# Altium footprint library PcbLib1.PcbLib: 49 footprints (part 2 of 4)
Each footprint in its own frame and in the unit in brackets; x right, y up, seen from the top. Pads: shape width x height; smd on the part's side, far side on the other; paste and mask are expansions set on the pad; w line width, h text height; cw(c..) or ccw(c..) is an arc to the next point about the centre after c.
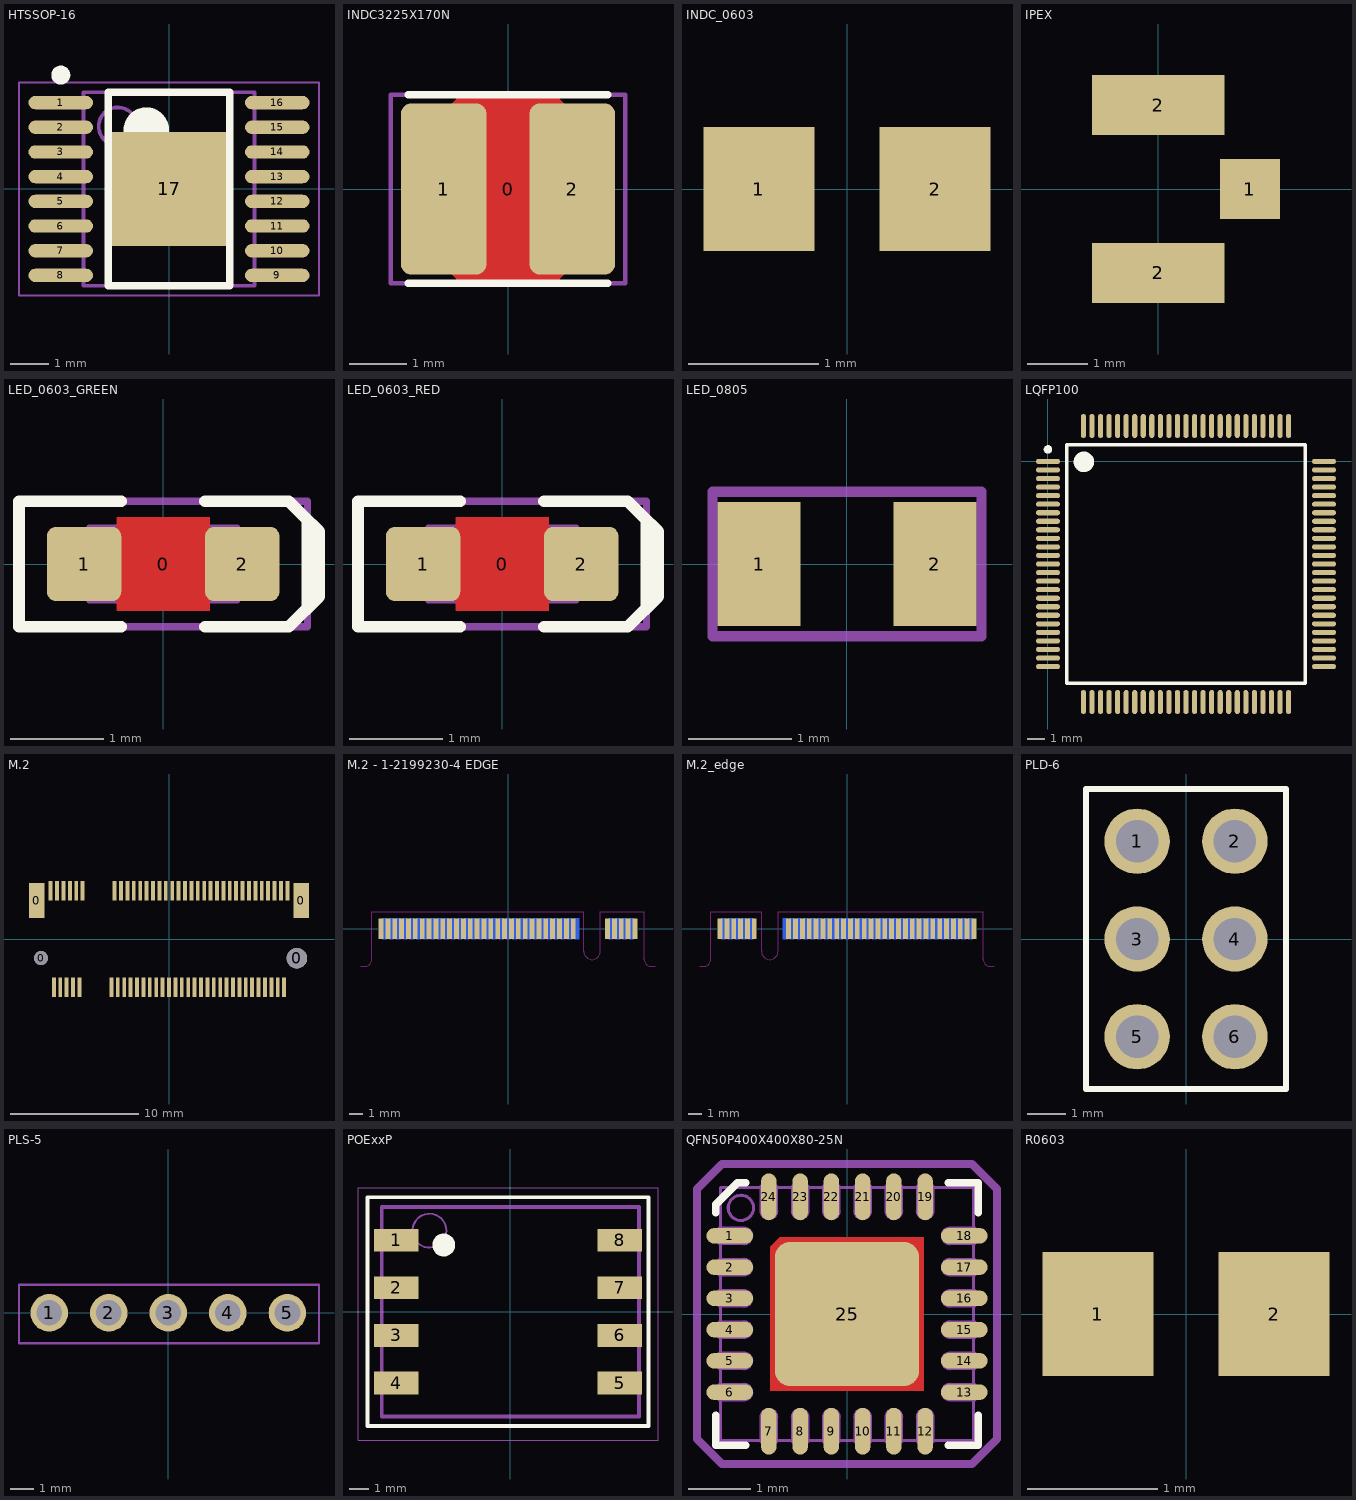
[diagram p1: the footprints below, top view; thin cyan lines are the x and y axes]

## HTSSOP-16 [mm] "HTSOP, 16-Leads, Body 5,00x4,40mm, Pitch 0,65mm, IPC Medium Density"
height 1.2
pads (17):
  oval 1.7x0.35 smd: 1(-2.85,2.275) 2(-2.85,1.625) 3(-2.85,0.975) 4(-2.85,0.325) 5(-2.85,-0.325) 6(-2.85,-0.975) 7(-2.85,-1.625) 8(-2.85,-2.275) 9(2.85,-2.275) 10(2.85,-1.625) 11(2.85,-0.975) 12(2.85,-0.325) 13(2.85,0.325) 14(2.85,0.975) 15(2.85,1.625) 16(2.85,2.275)
  rect 3x3 smd: 17(0,0)
Top Overlay:
  circle w0.6: c-0.6,1.55 r0.3
  circle w0.25: c-2.85,3 r0.125
  lines w0.2: -1.6,-2.55 1.6,-2.55 1.6,2.55 -1.6,2.55 -1.6,-2.55
Mechanical 13:
  circle w0.1: c-1.35,1.65 r0.5
  lines w0.1: -2.25,-2.55 2.25,-2.55 2.25,2.55 -2.25,2.55 -2.25,-2.55
Mechanical 15:
  lines w0.05: -3.95,-2.8 3.95,-2.8 3.95,2.8 -3.95,2.8 -3.95,-2.8
  lines w0.1: -0.5,0 0.5,0 ; 0,-0.5 0,0.5
3D body "User Library-TSSOP-16-1.step": height 1.1, standoff 0, extent -3.2,-2.5 3.2,2.5

## INDC3225X170N [mm] "Chip Inductor, 2-Leads, Body 3.2x2.5mm, IPC Medium Density"
height 1.7
pads (3):
  round 0.508 on Mech15: 0(0,0)
  rrect25% 1.5x3 smd: 1(-1.125,0) 2(1.125,0)
Top Layer:
  pour cut-out: -1.125,1.35 -0.825,1.65 0.825,1.65 1.125,1.35 1.125,-1.35 0.825,-1.65 -0.825,-1.65 -1.125,-1.35
Top Overlay:
  lines w0.127: -1.75,-1.651 1.75,-1.651 ; -1.75,1.651 1.75,1.651
Mechanical 13:
  lines w0.05: -1.7,-1.35 -1.7,1.35 1.7,1.35 1.7,-1.35 -1.7,-1.35
Mechanical 15:
  lines w0.076: -2.05,-1.65 2.05,-1.65 2.05,1.65 -2.05,1.65 -2.05,-1.65
3D body "INDC3225X170N.STEP": height 1.7, standoff 0, extent -1.71,-1.36 1.71,1.36

## INDC_0603 [mm] "Chip Inductor, 2-Leads, Body 1,60x1,00mm, IPC Medium Density"
height 1
pads (2):
  rect 0.85x0.95 smd: 1(-0.675,0) 2(0.675,0)
3D body "Coilcraft-0603CT.step": height 0.59, standoff -0.03, extent -0.785,-0.42 0.785,0.42

## IPEX [mm]
pads (3):
  rect 1x1 smd: 1(1.524,0)
  rect 2.2x1 smd: 2(0,-1.397) 2(0,1.397)
3D body "User Library-20279-001.step": height 1.25, standoff -0.01, extent -1.55,-1.5 1.55,1.5

## LED_0603_GREEN [mm]
height 0.8
pads (3):
  round 0.254 on Mech15: 0(0,0)
  rrect25% 0.8x0.8 smd: 1(-0.85,0) 2(0.85,0)
Top Layer:
  pour cut-out: -0.5,0.5 0.5,0.5 0.5,-0.5 -0.5,-0.5
Top Overlay:
  lines w0.127: -0.45,-0.675 -1.55,-0.675 -1.55,0.675 -0.45,0.675 ; 0.45,-0.675 1.35,-0.675 1.55,-0.475 1.55,0.475 1.35,0.675 0.45,0.675 ; 1.5,0.525 1.675,0.35 1.675,-0.35 1.525,-0.5
Mechanical 13:
  lines w0.05: -0.6,-0.4 -0.6,0.399 0.6,0.4 0.6,-0.4 -0.6,-0.399 ; -0.505,-0.398 -0.505,0.398 ; -0.5,-0.4 -0.8,-0.4 -0.8,0.4 -0.5,0.4 ; 0.5,-0.4 0.8,-0.4 0.8,0.4 0.5,0.4 ; 0.505,-0.398 0.505,0.398 ; -0.599,-0.398 -0.599,0.398 0.599,0.398 0.599,-0.398 -0.599,-0.398
Mechanical 15:
  lines w0.076: -1.55,-0.675 1.55,-0.675 1.55,0.675 -1.55,0.675 -1.55,-0.675
3D body "User Library-LED_0603_G.STEP": height 0.6, standoff 0, extent -0.8,-0.4 0.8,0.4

## LED_0603_RED [mm]
height 0.8
pads (3):
  round 0.254 on Mech15: 0(0,0)
  rrect25% 0.8x0.8 smd: 1(-0.85,0) 2(0.85,0)
Top Layer:
  pour cut-out: -0.5,0.5 0.5,0.5 0.5,-0.5 -0.5,-0.5
Top Overlay:
  lines w0.127: -0.45,-0.675 -1.55,-0.675 -1.55,0.675 -0.45,0.675 ; 0.45,-0.675 1.35,-0.675 1.55,-0.475 1.55,0.475 1.35,0.675 0.45,0.675 ; 1.5,0.525 1.675,0.35 1.675,-0.35 1.525,-0.5
Mechanical 13:
  lines w0.05: -0.6,-0.4 -0.6,0.399 0.6,0.4 0.6,-0.4 -0.6,-0.399 ; -0.505,-0.398 -0.505,0.398 ; -0.5,-0.4 -0.8,-0.4 -0.8,0.4 -0.5,0.4 ; 0.5,-0.4 0.8,-0.4 0.8,0.4 0.5,0.4 ; 0.505,-0.398 0.505,0.398 ; -0.599,-0.398 0.599,-0.398 0.599,0.398 -0.599,0.398 -0.599,-0.398
Mechanical 15:
  lines w0.076: -1.55,-0.675 -1.55,0.675 1.55,0.675 1.55,-0.675 -1.55,-0.675
3D body "LED 0603 APT1608 RED.STEP": height 0.75, standoff 0, extent -0.8,-0.4 0.8,0.4

## LED_0805 [mm]
pads (2):
  rect 0.8x1.2 smd: 1(-0.85,0) 2(0.85,0)
Mechanical 15:
  lines w0.1: -1.3,-0.7 -1.3,0.7 1.3,0.7 1.3,-0.7 -1.3,-0.7
3D body "LED-0805.step": height 0.9, standoff -0.01, extent -1.05,-0.675 1.05,0.675

## LQFP100 [mm]
pads (100):
  oval 1.4x0.3 smd: 1(0,0) 2(0,-0.5) 3(0,-1) 4(0,-1.5) 5(0,-2) 6(0,-2.5) 7(0,-3) 8(0,-3.5) 9(0,-4) 10(0,-4.5) 11(0,-5) 12(0,-5.5) 13(0,-6) 14(0,-6.5) 15(0,-7) 16(0,-7.5) 17(0,-8) 18(0,-8.5) 19(0,-9) 20(0,-9.5) 21(0,-10) 22(0,-10.5) 23(0,-11) 24(0,-11.5) 25(0,-12) 51(16.15,-12) 52(16.15,-11.5) 53(16.15,-11) 54(16.15,-10.5) 55(16.15,-10) 56(16.15,-9.5) 57(16.15,-9) 58(16.15,-8.5) 59(16.15,-8) 60(16.15,-7.5) 61(16.15,-7) 62(16.15,-6.5) 63(16.15,-6) 64(16.15,-5.5) 65(16.15,-5) 66(16.15,-4.5) 67(16.15,-4) 68(16.15,-3.5) 69(16.15,-3) 70(16.15,-2.5) 71(16.15,-2) 72(16.15,-1.5) 73(16.15,-1) 74(16.15,-0.5) 75(16.15,0)
  oval 0.3x1.4 smd: 26(2.075,-14.075) 27(2.575,-14.075) 28(3.075,-14.075) 29(3.575,-14.075) 30(4.075,-14.075) 31(4.575,-14.075) 32(5.075,-14.075) 33(5.575,-14.075) 34(6.075,-14.075) 35(6.575,-14.075) 36(7.075,-14.075) 37(7.575,-14.075) 38(8.075,-14.075) 39(8.575,-14.075) 40(9.075,-14.075) 41(9.575,-14.075) 42(10.075,-14.075) 43(10.575,-14.075) 44(11.075,-14.075) 45(11.575,-14.075) 46(12.075,-14.075) 47(12.575,-14.075) 48(13.075,-14.075) 49(13.575,-14.075) 50(14.075,-14.075) 76(14.075,2.075) 77(13.575,2.075) 78(13.075,2.075) 79(12.575,2.075) 80(12.075,2.075) 81(11.575,2.075) 82(11.075,2.075) 83(10.575,2.075) 84(10.075,2.075) 85(9.575,2.075) 86(9.075,2.075) 87(8.575,2.075) 88(8.075,2.075) 89(7.575,2.075) 90(7.075,2.075) 91(6.575,2.075) 92(6.075,2.075) 93(5.575,2.075) 94(5.075,2.075) 95(4.575,2.075) 96(4.075,2.075) 97(3.575,2.075) 98(3.075,2.075) 99(2.575,2.075) 100(2.075,2.075)
Top Overlay:
  circle w0.25: c0,0.7 r0.125
  circle w0.6: c2.1,-0.025 r0.3
  lines w0.2: 1.1,-12.975 1.1,0.975 15.05,0.975 15.05,-12.975 1.1,-12.975
Mechanical 13:
  lines w0.1: 1.075,-13 1.075,1 15.075,1 15.075,-13 1.075,-13
3D body "LQFP100_05.step": height 1.6, standoff 0, extent 0.075,-14 16.075,2

## M.2 [mm]
pads (71):
  rect 1.2x2.75 smd: 0(-10.35,3) 0(10.35,3)
  round 1.1 hole 1.1 unplated: 0(-10,-1.5)
  round 1.6 hole 1.6 unplated: 0(10,-1.5)
  rect 0.3x1.55 smd: 1(-9.25,3.775) 2(-8.75,3.775) 3(-8.25,3.775) 4(-7.75,3.775) 5(-7.25,3.775) 6(-6.75,3.775) 7(-4.25,3.775) 8(-3.75,3.775) 9(-3.25,3.775) 10(-2.75,3.775) 11(-2.25,3.775) 12(-1.75,3.775) 13(-1.25,3.775) 14(-0.75,3.775) 15(-0.25,3.775) 16(0.25,3.775) 17(0.75,3.775) 18(1.25,3.775) 19(1.75,3.775) 20(2.25,3.775) 21(2.75,3.775) 22(3.25,3.775) 23(3.75,3.775) 24(4.25,3.775) 25(4.75,3.775) 26(5.25,3.775) 27(5.75,3.775) 28(6.25,3.775) 29(6.75,3.775) 30(7.25,3.775) 31(7.75,3.775) 32(8.25,3.775) 33(8.75,3.775) 34(9.25,3.775) 35(9,-3.775) 36(8.5,-3.775) 37(8,-3.775) 38(7.5,-3.775) 39(7,-3.775) 40(6.5,-3.775) 41(6,-3.775) 42(5.5,-3.775) 43(5,-3.775) 44(4.5,-3.775) 45(4,-3.775) 46(3.5,-3.775) 47(3,-3.775) 48(2.5,-3.775) 49(2,-3.775) 50(1.5,-3.775) 51(1,-3.775) 52(0.5,-3.775) 53(0,-3.775) 54(-0.5,-3.775) 55(-1,-3.775) 56(-1.5,-3.775) 57(-2,-3.775) 58(-2.5,-3.775) 59(-3,-3.775) 60(-3.5,-3.775) 61(-4,-3.775) 62(-4.5,-3.775) 63(-7,-3.775) 64(-7.5,-3.775) 65(-8,-3.775) 66(-8.5,-3.775) 67(-9,-3.775)
3D body "M_2.stp": height 4.09, standoff -0.62, extent -10.95,-4.3 10.95,4.4

## M.2 - 1-2199230-4 EDGE [mm]
pads (67):
  rect 0.35x1.5 smd: 1(-9.25,0) 2(-8.75,0) 3(-8.25,0) 4(-7.75,0) 5(-7.25,0) 6(-6.75,0) 7(-6.25,0) 8(-5.75,0) 9(-5.25,0) 10(-4.75,0) 11(-4.25,0) 12(-3.75,0) 13(-3.25,0) 14(-2.75,0) 15(-2.25,0) 16(-1.75,0) 17(-1.25,0) 18(-0.75,0) 19(-0.25,0) 20(0.25,0) 21(0.75,0) 22(1.25,0) 23(1.75,0) 24(2.25,0) 25(2.75,0) 26(3.25,0) 27(3.75,0) 28(4.25,0) 29(4.75,0) 30(7.25,0) 31(7.75,0) 32(8.25,0) 33(8.75,0) 34(9.25,0)
  rect 0.35x1.5 smd far side: 35(9,0) 36(8.5,0) 37(8,0) 38(7.5,0) 39(5,0) 40(4.5,0) 41(4,0) 42(3.5,0) 43(3,0) 44(2.5,0) 45(2,0) 46(1.5,0) 47(1,0) 48(0.5,0) 49(0,0) 50(-0.5,0) 51(-1,0) 52(-1.5,0) 53(-2,0) 54(-2.5,0) 55(-3,0) 56(-3.5,0) 57(-4,0) 58(-4.5,0) 59(-5,0) 60(-5.5,0) 61(-6,0) 62(-6.5,0) 63(-7,0) 64(-7.5,0) 65(-8,0) 66(-8.5,0) 67(-9,0)
Top Solder:
  region: 6.7,1.25 6.7,-1.375 9.925,-1.375 9.925,1.25
  region: -9.925,1.25 -9.925,-1.375 5.5,-1.375 5.5,1.25
Bottom Solder:
  region: 6.7,1.25 6.7,-1.375 9.925,-1.375 9.925,1.25
  region: -9.925,1.25 -9.925,-1.375 5.5,-1.375 5.5,1.25
Keep-Out Layer:
  lines w0.05: -10.725,-2.75 -10.425,-2.75 ccw(c-10.425,-2.25) -9.925,-2.25 -9.925,1.25 5.525,1.25 5.525,-1.65 ccw(c6.125,-1.65) 6.725,-1.65 6.725,1.25 9.925,1.25 9.925,-2.25 ccw(c10.425,-2.25) 10.425,-2.75 10.725,-2.75

## M.2_edge [mm]
pads (67):
  rect 0.35x1.5 smd: 1(-9.25,0) 2(-8.75,0) 3(-8.25,0) 4(-7.75,0) 5(-7.25,0) 6(-6.75,0) 7(-4.25,0) 8(-3.75,0) 9(-3.25,0) 10(-2.75,0) 11(-2.25,0) 12(-1.75,0) 13(-1.25,0) 14(-0.75,0) 15(-0.25,0) 16(0.25,0) 17(0.75,0) 18(1.25,0) 19(1.75,0) 20(2.25,0) 21(2.75,0) 22(3.25,0) 23(3.75,0) 24(4.25,0) 25(4.75,0) 26(5.25,0) 27(5.75,0) 28(6.25,0) 29(6.75,0) 30(7.25,0) 31(7.75,0) 32(8.25,0) 33(8.75,0) 34(9.25,0)
  rect 0.35x1.5 smd far side: 35(9,0) 36(8.5,0) 37(8,0) 38(7.5,0) 39(7,0) 40(6.5,0) 41(6,0) 42(5.5,0) 43(5,0) 44(4.5,0) 45(4,0) 46(3.5,0) 47(3,0) 48(2.5,0) 49(2,0) 50(1.5,0) 51(1,0) 52(0.5,0) 53(0,0) 54(-0.5,0) 55(-1,0) 56(-1.5,0) 57(-2,0) 58(-2.5,0) 59(-3,0) 60(-3.5,0) 61(-4,0) 62(-4.5,0) 63(-7,0) 64(-7.5,0) 65(-8,0) 66(-8.5,0) 67(-9,0)
Top Solder:
  region: -5.025,1.25 -5.025,-1.375 9.925,-1.375 9.925,1.25
  region: -9.925,1.25 -9.925,-1.375 -6.225,-1.375 -6.225,1.25
Bottom Solder:
  region: -5.025,1.25 -5.025,-1.375 9.925,-1.375 9.925,1.25
  region: -9.925,1.25 -9.925,-1.375 -6.225,-1.375 -6.225,1.25
Keep-Out Layer:
  lines w0.05: -10.725,-2.75 -10.425,-2.75 ccw(c-10.425,-2.25) -9.925,-2.25 -9.925,1.25 -6.225,1.25 -6.225,-1.65 ccw(c-5.625,-1.65) -5.025,-1.65 -5.025,1.25 9.925,1.25 9.925,-2.25 ccw(c10.425,-2.25) 10.425,-2.75 10.725,-2.75

## PLD-6 [mm]
pads (6):
  round 1.7 hole 1.1: 1(-1.27,2.54) 2(1.27,2.54) 3(-1.27,0) 4(1.27,0) 5(-1.27,-2.54) 6(1.27,-2.54)
Top Overlay:
  lines w0.15: -2.6,-3.9 -2.6,3.9 2.6,3.9 2.6,-3.9 -2.6,-3.9
Mechanical 15:
  lines w0.15: -2.6,-3.9 -2.6,3.9 2.6,3.9 2.6,-3.9 -2.6,-3.9
  text ".Designator" at -1.7,-0.3 h0.5
3D body "User Library-2x3 TH Pitch 2_54mm.STEP": height 9.2, standoff -3.5, extent -2.555,-3.81 2.525,3.81

## PLS-5 [mm]
pads (5):
  round 1.6 hole 1.1: 1(-5.08,0) 2(-2.54,0) 3(0,0) 4(2.54,0) 5(5.08,0)
Mechanical 15:
  lines w0.1: -6.37,-1.3 -6.37,1.2 6.43,1.2 6.43,-1.3 -6.37,-1.3
  text ".Designator" at -1.9,-0.2 h0.5
3D body "PLS-5.step": height 8.54, standoff -3, extent -6.35,-1.3 6.35,1.24

## POExxP [mm]
height 10
pads (8):
  rect 2.335x1.19 smd: 1(-6,3.75) 2(-6,1.25) 3(-6,-1.25) 4(-6,-3.75) 5(5.75,-3.75) 6(5.75,-1.25) 7(5.75,1.25) 8(5.75,3.75)
Top Overlay:
  circle w0.6: c-3.5,3.5 r0.3
  lines w0.2: -7.5,-6 7.25,-6 7.25,6 -7.5,6 -7.5,-6
Mechanical 13:
  circle w0.1: c-4.25,4.25 r0.889
  lines w0.2: -6.75,-5.5 6.75,-5.5 6.75,5.5 -6.75,5.5 -6.75,-5.5
Mechanical 15:
  lines w0.05: -8,-6.75 7.75,-6.75 7.75,6.5 -8,6.5 -8,-6.75
3D body "Coilcraft-POE30P-50L.step": height 8.77, standoff -0.25, extent -6.6,-5.46 6.6,5.46

## QFN50P400X400X80-25N [mm] "QFN, 24-Leads with exposed die pad, Body 4.05x4.05mm (max), Pitch 0.50mm, IPC Medium Density"
height 0.8
pads (25):
  oval 0.75x0.25 smd mask+0.075: 1(-1.875,1.25) 2(-1.875,0.75) 3(-1.875,0.25) 4(-1.875,-0.25) 5(-1.875,-0.75) 6(-1.875,-1.25) 13(1.875,-1.25) 14(1.875,-0.75) 15(1.875,-0.25) 16(1.875,0.25) 17(1.875,0.75) 18(1.875,1.25)
  oval 0.25x0.75 smd mask+0.075: 7(-1.25,-1.875) 8(-0.75,-1.875) 9(-0.25,-1.875) 10(0.25,-1.875) 11(0.75,-1.875) 12(1.25,-1.875) 19(1.25,1.875) 20(0.75,1.875) 21(0.25,1.875) 22(-0.25,1.875) 23(-0.75,1.875) 24(-1.25,1.875)
  rrect20% 2.3x2.3 smd paste-1.7: 25(0,0)
Top Layer:
  region: 1.025,-1.225 1.225,-1.225 1.225,1.225 1.025,1.225
  region: 1.225,-1.225 1.225,-1.025 -1.225,-1.025 -1.225,-1.225
  region: -1.225,1.075 -1.075,1.225 1.225,1.225 1.225,1.075
  region: -1.075,1.225 -1.225,1.075 -1.225,-1.225 -1.075,-1.225
Top Overlay:
  lines w0.127: -2.1,-1.625 -2.1,-2.1 -1.625,-2.1 ; -2.1,1.625 -2.1,1.75 -1.75,2.1 -1.625,2.1 ; 1.625,-2.1 2.1,-2.1 2.1,-1.625 ; 1.625,2.1 2.1,2.1 2.1,1.625
  text "." at -2.63,1.25 h0.05
Mechanical 13:
  circle w0.05: c-1.698,1.698 r0.202
  lines w0.05: -2.025,-1.375 -2.025,-2.025 -1.375,-2.025 ; -2.025,-1.125 -2.025,-0.875 ; -2.025,-0.625 -2.025,-0.375 ; -2.025,-0.125 -2.025,0.125 ; -2.025,0.375 -2.025,0.625 ; -2.025,0.875 -2.025,1.125 ; -2.025,1.375 -2.025,2.025 -1.375,2.025 ; -1.125,-2.025 -0.875,-2.025 ; -1.125,2.025 -0.875,2.025 ; -0.625,-2.025 -0.375,-2.025 ; -0.625,2.025 -0.375,2.025 ; -0.125,-2.025 0.125,-2.025 ; -0.125,2.025 0.125,2.025 ; 0.375,-2.025 0.625,-2.025 ; 0.375,2.025 0.625,2.025 ; 0.875,-2.025 1.125,-2.025 ; 0.875,2.025 1.125,2.025 ; 1.375,-2.025 2.025,-2.025 2.025,-1.375 ; 1.375,2.025 2.025,2.025 2.025,1.375 ; 2.025,-1.125 2.025,-0.875 ; 2.025,-0.625 2.025,-0.375 ; 2.025,-0.125 2.025,0.125 ; 2.025,0.375 2.025,0.625 ; 2.025,0.875 2.025,1.125 ; -2.045,-1.375 -1.65,-1.375 ccw(c-1.65,-1.25) -1.65,-1.125 -2.045,-1.125 -2.045,-1.375 ; -2.045,-0.875 -1.65,-0.875 ccw(c-1.65,-0.75) -1.65,-0.625 -2.045,-0.625 -2.045,-0.875 ; -2.045,-0.375 -1.65,-0.375 ccw(c-1.65,-0.25) -1.65,-0.125 -2.045,-0.125 -2.045,-0.375 ; -2.045,0.125 -1.65,0.125 ccw(c-1.65,0.25) -1.65,0.375 -2.045,0.375 -2.045,0.125 ; -2.045,0.625 -1.65,0.625 ccw(c-1.65,0.75) -1.65,0.875 -2.045,0.875 -2.045,0.625 ; -2.045,1.125 -1.65,1.125 ccw(c-1.65,1.25) -1.65,1.375 -2.045,1.375 -2.045,1.125 ; -1.375,-2.045 -1.375,-1.65 cw(c-1.25,-1.65) -1.125,-1.65 -1.125,-2.045 -1.375,-2.045 ; -1.375,1.65 ccw(c-1.25,1.65) -1.125,1.65 -1.125,2.045 -1.375,2.045 -1.375,1.65 ; -0.875,-2.045 -0.875,-1.65 cw(c-0.75,-1.65) -0.625,-1.65 -0.625,-2.045 -0.875,-2.045 ; -0.875,1.65 ccw(c-0.75,1.65) -0.625,1.65 -0.625,2.045 -0.875,2.045 -0.875,1.65 ; -0.375,-2.045 -0.375,-1.65 cw(c-0.25,-1.65) -0.125,-1.65 -0.125,-2.045 -0.375,-2.045 ; -0.375,1.65 ccw(c-0.25,1.65) -0.125,1.65 -0.125,2.045 -0.375,2.045 -0.375,1.65 ; 0.125,-2.045 0.125,-1.65 cw(c0.25,-1.65) 0.375,-1.65 0.375,-2.045 0.125,-2.045 ; 0.125,1.65 ccw(c0.25,1.65) 0.375,1.65 0.375,2.045 0.125,2.045 0.125,1.65 ; 0.625,-2.045 0.625,-1.65 cw(c0.75,-1.65) 0.875,-1.65 0.875,-2.045 0.625,-2.045 ; 0.625,1.65 ccw(c0.75,1.65) 0.875,1.65 0.875,2.045 0.625,2.045 0.625,1.65 ; 1.125,-2.045 1.125,-1.65 cw(c1.25,-1.65) 1.375,-1.65 1.375,-2.045 1.125,-2.045 ; 1.125,1.65 ccw(c1.25,1.65) 1.375,1.65 1.375,2.045 1.125,2.045 1.125,1.65 ; 1.65,-1.375 cw(c1.65,-1.25) 1.65,-1.125 2.045,-1.125 2.045,-1.375 1.65,-1.375 ; 1.65,-0.875 cw(c1.65,-0.75) 1.65,-0.625 2.045,-0.625 2.045,-0.875 1.65,-0.875 ; 1.65,-0.375 cw(c1.65,-0.25) 1.65,-0.125 2.045,-0.125 2.045,-0.375 1.65,-0.375 ; 1.65,0.125 cw(c1.65,0.25) 1.65,0.375 2.045,0.375 2.045,0.125 1.65,0.125 ; 1.65,0.625 cw(c1.65,0.75) 1.65,0.875 2.045,0.875 2.045,0.625 1.65,0.625 ; 1.65,1.125 cw(c1.65,1.25) 1.65,1.375 2.045,1.375 2.045,1.125 1.65,1.125
Mechanical 15:
  lines w0.127: -2.4,-2 -2.4,2 -2,2.4 2,2.4 2.4,2 2.4,-2 2,-2.4 -2,-2.4 -2.4,-2
3D body "QFN50P400X400X80-25N.STEP": height 0.8, standoff 0, extent -2.045,-2.045 2.045,2.045

## R0603 [mm]
pads (2):
  rect 0.85x0.95 smd: 1(-0.675,0) 2(0.675,0)
3D body "RES0603.step": height 0.45, standoff 0, extent -0.8,-0.4 0.8,0.4